# Altium footprint library PCB贴片元件封装库.pcblib: 366 footprints (part 12 of 23)
Each footprint in its own frame and in the unit in brackets; x right, y up, seen from the top. Pads: shape width x height; smd on the part's side, far side on the other; paste and mask are expansions set on the pad; w line width, h text height; cw(c..) or ccw(c..) is an arc to the next point about the centre after c.
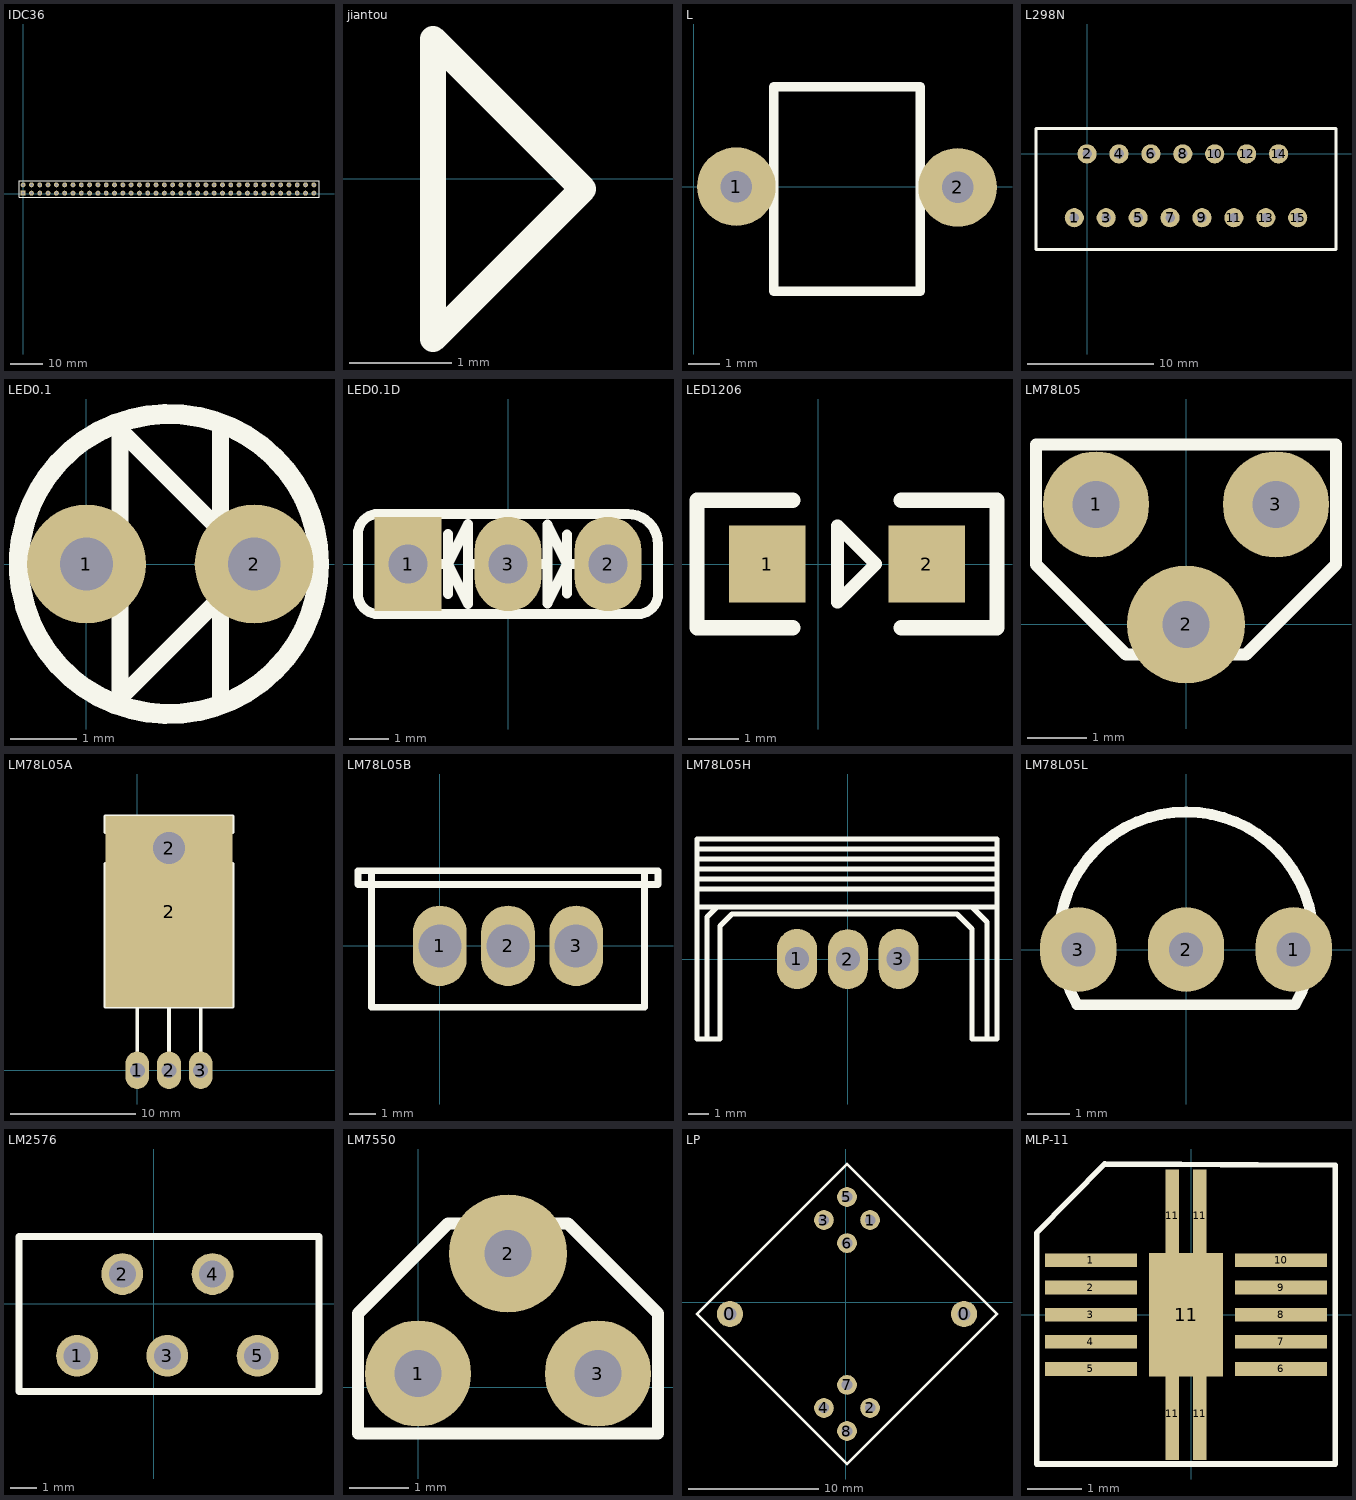
[diagram p11: the footprints below, top view; thin cyan lines are the x and y axes]

## IDC36 [mm]
pads (72):
  rect 1.5x1.5 hole 0.9: 1(0,0.127)
  round 1.5 hole 0.9: 2(0,2.667) 3(2.54,0.127) 4(2.54,2.667) 5(5.08,0.127) 6(5.08,2.667) 7(7.62,0.127) 8(7.62,2.667) 9(10.16,0.127) 10(10.16,2.667) 11(12.7,0.127) 12(12.7,2.667) 13(15.24,0.127) 14(15.24,2.667) 15(17.78,0.127) 16(17.78,2.667) 17(20.32,0.127) 18(20.32,2.667) 19(22.86,0.127) 20(22.86,2.667) 21(25.4,0.127) 22(25.4,2.667) 23(27.94,0.127) 24(27.94,2.667) 25(30.48,0.127) 26(30.48,2.667) 27(33.02,0.127) 28(33.02,2.667) 29(35.56,0.127) 30(35.56,2.667) 31(38.1,0.127) 32(38.1,2.667) 33(40.64,0.127) 34(40.64,2.667) 35(43.18,0.127) 36(43.18,2.667) 37(45.72,0.127) 38(45.72,2.667) 39(48.26,0.127) 40(48.26,2.667) 41(50.8,0.127) 42(50.8,2.667) 43(53.34,0.127) 44(53.34,2.667) 45(55.88,0.127) 46(55.88,2.667) 47(58.42,0.127) 48(58.42,2.667) 49(60.96,0.127) 50(60.96,2.667) 51(63.5,0.127) 52(63.5,2.667) 53(66.04,0.127) 54(66.04,2.667) 55(68.58,0.127) 56(68.58,2.667) 57(71.12,0.127) 58(71.12,2.667) 59(73.66,0.127) 60(73.66,2.667) 61(76.2,0.127) 62(76.2,2.667) 63(78.74,0.127) 64(78.74,2.667) 65(81.28,0.127) 66(81.28,2.667) 67(83.82,0.127) 68(83.82,2.667) 69(86.36,0.127) 70(86.36,2.667) 71(88.9,0.127) 72(88.9,2.667)
TopOverlay:
  lines w0.2: -1.27,-1.143 90.475,-1.143 90.475,3.937 -1.27,3.937 -1.27,-1.143

## jiantou [mil]
TopOverlay:
  lines w10: 52.5,-61.5 52.5,53.5 110,-4 52.5,-61.5

## L [mm]
pads (2):
  round 2.5 hole 1: 1(1.346,0) 2(8.382,-0.025)
TopOverlay:
  lines w0.3: 2.54,-3.327 7.188,-3.327 ; 2.54,3.175 7.188,3.175
  lines w0.305: 1.778,-0.025 2.54,-0.025 ; 2.54,-3.327 2.54,3.175 ; 7.188,-3.327 7.188,3.175 ; 7.188,-0.076 7.663,-0.076

## L298N [mil]
pads (15):
  round 60 hole 30: 1(-40,-200) 2(0,0) 3(60,-200) 4(100,0) 5(160,-200) 6(200,0) 7(260,-200) 8(300,0) 9(360,-200) 10(400,0) 11(460,-200) 12(500,0) 13(560,-200) 14(600,0) 15(660,-200)
TopOverlay:
  lines w10: -160,-300 -160,80 -140,80 780,80 780,-300 -160,-300

## LED0.1 [mm]
pads (2):
  round 1.8 hole 0.8: 1(0,0) 2(2.54,0)
TopOverlay:
  circle w0.305: c1.25,0 r2.272
  lines w0.254: 2.032,-2.032 2.032,2.032 ; 2.032,-0.508 0.508,-2.032 0.508,2.032 2.032,0.508

## LED0.1D [mm]
pads (3):
  rect 1.7x2.4 hole 1: 1(-2.54,0)
  oval 1.7x2.4 hole 1: 2(2.54,0) 3(0,0)
TopOverlay:
  lines w0.254: -2.032,0 -1.524,0 ; -1.524,-0.762 -1.524,0.762 ; -1.016,0 -0.508,0 ; 0.762,0 1,0 ; 1.496,-0.754 1.496,0.746 ; 2.032,0 1.5,0 ; -1.524,0 -1.016,1.016 -1.016,-1.016 -1.524,0 ; 1,1 1.5,0 ; 1,1 1.5,0 ; 1,1 1,-1 1.5,0 ; -3.81,-0.762 ccw(c-3.302,-0.762) -3.302,-1.27 3.302,-1.27 ccw(c3.302,-0.762) 3.81,-0.762 3.81,0.508 ccw(c3.048,0.508) 3.048,1.27 -3.302,1.27 ccw(c-3.302,0.762) -3.81,0.762 -3.81,-0.762

## LED1206 [mil]
pads (2):
  rect 60x60 smd: 1(-40,0) 2(85,0)
TopOverlay:
  lines w10: 15,-30 45,0 15,30 15,-30
  lines w12: -20,-50 -95,-50 -95,50 -20,50 ; 65,-50 140,-50 140,50 65,50

## LM78L05 [mm]
pads (3):
  round 1.8 hole 0.8: 1(-1.524,2.032) 3(1.524,2.032)
  round 2 hole 0.8: 2(0,0)
TopOverlay:
  lines w0.203: -2.54,1.016 -2.54,3.048 2.54,3.048 2.54,1.016 1.016,-0.508 -1.016,-0.508 -2.54,1.016

## LM78L05A [mm]
pads (5):
  oval 1.9x3 hole 1.2: 1(0,0) 2(2.54,0) 3(5.08,0)
  rect 10.2x15.3 smd: 2(2.54,12.7)
  round 3 hole 2.54: 2(2.54,17.78)
TopOverlay:
  lines w0.305: 0,1.524 0,5.08 ; 2.54,1.524 2.54,5.08 ; 5.08,1.524 5.08,5.08 ; -2.54,5.08 -2.54,16.51 -1.27,16.51 -1.27,19.05 -2.54,19.05 -2.54,20.32 7.62,20.32 7.62,19.05 6.35,19.05 6.35,16.51 7.62,16.51 7.62,5.08 -2.54,5.08

## LM78L05B [mm]
pads (3):
  oval 2x3 hole 1.6: 1(0,0) 2(2.54,0) 3(5.08,0)
TopOverlay:
  lines w0.254: -2.54,2.794 -3.048,2.794 -3.048,2.286 -2.54,2.286 7.62,2.286 8.128,2.286 8.128,2.794 7.62,2.794 ; -2.54,2.794 -2.54,-2.286 7.62,-2.286 7.62,2.794 ; -2.54,2.794 7.62,2.794

## LM78L05H [mm]
pads (3):
  oval 2x3 hole 1.2: 1(-2.544,0.006) 2(0,0) 3(2.536,0.006)
TopOverlay:
  lines w0.254: -7.544,2.61 7.456,2.61 ; -7.544,3.506 7.456,3.506 ; -7.544,4.006 7.456,4.006 ; -7.544,4.506 7.456,4.506 ; -7.544,5.006 7.456,5.006 ; -7.544,5.506 7.456,5.506 ; -7.044,-3.994 -7.044,2.11 -6.544,2.61 ; 6.206,2.61 6.956,1.86 6.956,-3.994 ; -7.544,-3.994 -6.392,-3.994 -6.392,1.658 -5.794,2.256 5.456,2.256 6.206,1.506 6.206,-3.994 7.456,-3.994 7.456,6.006 -7.544,6.006 -7.544,-3.994

## LM78L05L [mm]
pads (3):
  oval 1.8x2 hole 0.8: 1(2.54,0) 2(0,0) 3(-2.54,0)
TopOverlay:
  lines w0.254: -2.594,-1.25 cw(c0.004,0.25) 2.602,-1.25 ; -2.576,-1.3 2.574,-1.3

## LM2576 [mil]
pads (5):
  round 62 hole 40: 1(-113.86,-77) 2(-46.76,44.28) 3(20,-77) 4(87.1,44.28) 5(153.86,-77)
TopOverlay:
  lines w10: -200,-130 245,-130 245,100 -200,100 -200,-130

## LM7550 [mm]
pads (3):
  round 1.8 hole 0.8: 1(0,0.229) 3(3.048,0.229)
  round 2 hole 0.8: 2(1.524,2.261)
TopOverlay:
  lines w0.203: -1.016,-0.787 4.064,-0.787 4.064,1.245 2.54,2.769 0.508,2.769 -1.016,1.245 -1.016,-0.787

## LP [mil]
pads (10):
  round 80 hole 40: 0(-351.18,-35.98) 0(358.82,-35.98)
  round 60 hole 32: 1(73.82,249.02) 2(73.82,-320.98) 3(-66.18,249.02) 4(-66.18,-320.99) 5(3.82,319.02) 6(3.82,179.02) 7(3.82,-250.98) 8(3.82,-390.98)
TopOverlay:
  lines w10: -451.18,-35.98 3.82,-490.98 458.82,-35.99 3.82,419.01 -451.18,-35.98

## MLP-11 [mm]
pads (15):
  rect 1.7x0.25 smd: 1(-1.849,1) 2(-1.849,0.5) 3(-1.849,0) 4(-1.849,-0.5) 5(-1.849,-1) 6(1.651,-1) 7(1.651,-0.5) 8(1.651,0) 9(1.651,0.5) 10(1.651,1)
  rect 0.25x1.7 smd: 11(-0.349,-1.825) 11(-0.349,1.825) 11(0.151,-1.825) 11(0.151,1.825)
  rect 1.36x2.27 smd: 11(-0.099,0)
TopOverlay:
  lines w0.102: -2.849,-2.75 -0.099,-2.75 2.651,-2.75 2.651,2.75 -1.599,2.775 -2.849,1.5 -2.849,-2.75